# Altium footprint library SINA.PcbLib: 103 footprints (part 3 of 7)
Each footprint in its own frame and in the unit in brackets; x right, y up, seen from the top. Pads: shape width x height; smd on the part's side, far side on the other; paste and mask are expansions set on the pad; w line width, h text height; cw(c..) or ccw(c..) is an arc to the next point about the centre after c.
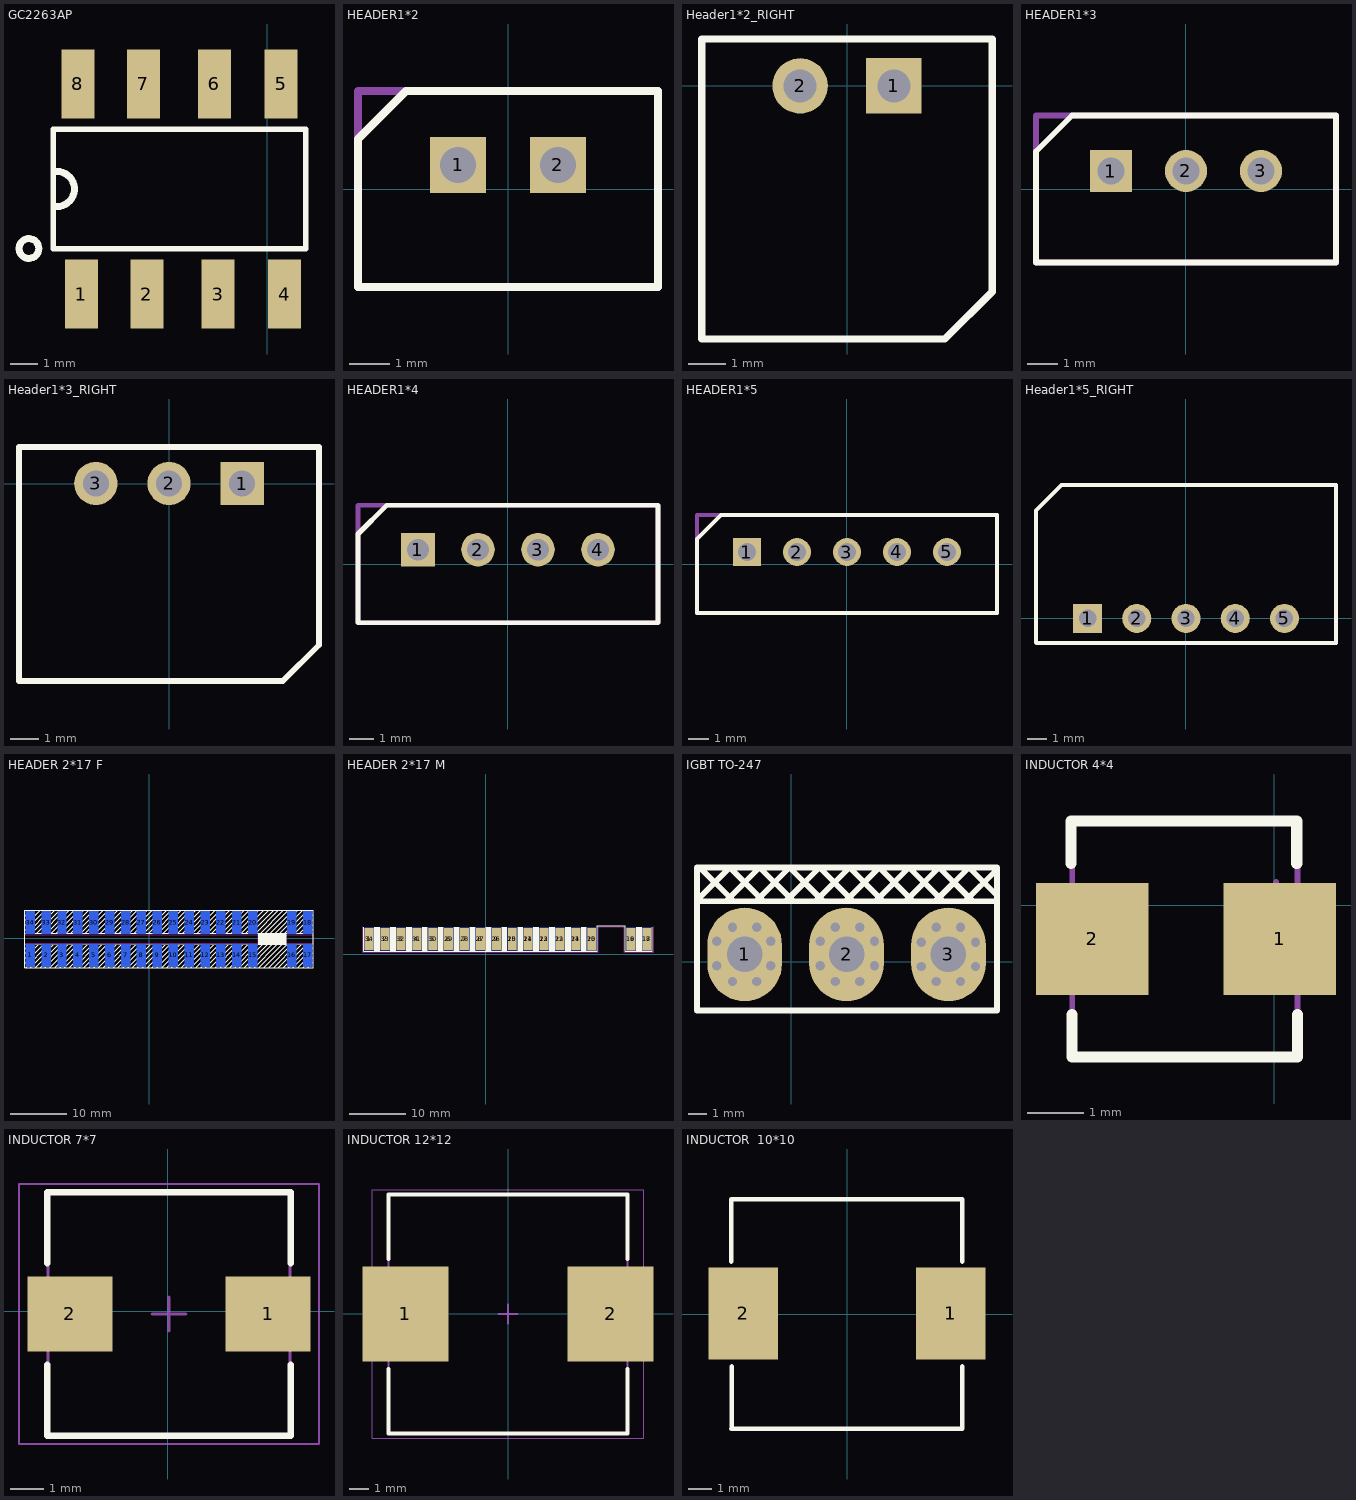
[diagram p2: the footprints below, top view; thin cyan lines are the x and y axes]

## GC2263AP [mm]
pads (8):
  rect 1.2x2.5 smd: 1(-6.731,2.413) 2(-4.36,2.413) 3(-1.778,2.413) 4(0.635,2.413) 5(0.508,10.033) 6(-1.905,10.033) 7(-4.487,10.033) 8(-6.858,10.033)
Top Overlay:
  circle w0.254: c-8.636,4.064 r0.359
  lines w0.2: -7.747,4.064 -7.747,8.382 1.397,8.382 1.397,4.064 -7.747,4.064
  lines w0.254: -7.62,5.588 ccw(c-7.62,6.223) -7.62,6.858
3D body "User Library-DIP-8P-M01.STEP": height 4.36, standoff -3, extent -7.876,2.288 1.524,10.158

## HEADER1*2 [mm] "2.50mm Male Shrouded Header, 2p"
height 5.9
pads (2):
  rect 1.4x1.4 hole 0.9: 1(-1.25,0.6) 2(1.25,0.6)
Top Overlay:
  lines w0.2: -3.75,-2.45 3.75,-2.45 3.75,2.45 -2.55,2.45 -3.75,1.25 -3.75,-2.45
Mechanical 13:
  lines w0.2: -3.75,-2.45 3.75,-2.45 3.75,2.45 -3.75,2.45 -3.75,-2.45
3D body "64600211622.stp": height 5.95, standoff -3.45, extent -3.75,-2.45 3.75,2.45

## Header1*2_RIGHT [mm] "2.50mm  Pitch Mini-SPOX Wire-to-Board Crimp Housing, Friction Lock, 2 Circuits, Right male"
pads (2):
  rect 1.5x1.5 hole 0.9: 1(1.27,0)
  round 1.5 hole 0.9: 2(-1.27,0)
Top Overlay:
  lines w0.2: -3.937,-6.858 2.61,-6.858 2.652,-6.858 3.937,-5.573 3.937,1.27 -3.937,1.27 -3.937,-6.858

## HEADER1*3 [mm] "2.50mm Male Shrouded Header, 3p"
height 5.9
pads (3):
  rect 1.4x1.4 hole 0.9: 1(-2.5,0.6)
  round 1.4 hole 0.9: 2(0,0.6) 3(2.5,0.6)
Top Overlay:
  lines w0.2: -3.8,2.45 -5,1.25 -5,-2.45 5,-2.45 5,2.45 -3.75,2.45
Mechanical 13:
  lines w0.2: -5,-2.45 5,-2.45 5,2.45 -5,2.45 -5,-2.45
3D body "64600311622.stp": height 5.95, standoff -3.45, extent -5,-2.45 5,2.45

## Header1*3_RIGHT [mm] "2.50mm  Pitch Mini-SPOX Wire-to-Board Crimp Housing, Friction Lock, 3 Circuits, Right male"
pads (3):
  rect 1.5x1.5 hole 0.9: 1(2.54,-0.001)
  round 1.5 hole 0.9: 2(0,0.002) 3(-2.54,0.002)
Top Overlay:
  lines w0.2: -5.207,-6.858 -5.207,1.272 5.207,1.272 5.207,-5.603 3.952,-6.858 -5.207,-6.858

## HEADER1*4 [mm] "2.50mm Male Shrouded Header, 4p"
height 5.9
pads (4):
  rect 1.4x1.4 hole 0.9: 1(-3.75,0.6)
  round 1.4 hole 0.9: 2(-1.25,0.6) 3(1.25,0.6) 4(3.75,0.6)
Top Overlay:
  lines w0.2: -5.05,2.45 -6.25,1.25 -6.25,-2.45 6.25,-2.45 6.25,2.45 -5,2.45
Mechanical 13:
  lines w0.2: -6.25,-2.45 -6.25,2.45 6.25,2.45 6.25,-2.45 -6.25,-2.45
3D body "64600411622.stp": height 5.95, standoff -3.45, extent -6.25,-2.45 6.25,2.45

## HEADER1*5 [mm] "2.50mm Male Shrouded Header, 5p"
height 5.9
pads (5):
  rect 1.4x1.4 hole 0.9: 1(-5,0.6)
  round 1.4 hole 0.9: 2(-2.5,0.6) 3(0,0.6) 4(2.5,0.6) 5(5,0.6)
Top Overlay:
  lines w0.2: 7.5,-2.45 -7.5,-2.45 -7.5,1.25 -6.3,2.45 7.5,2.45 7.5,-2.45
Mechanical 13:
  lines w0.2: -7.5,-2.45 -7.5,2.45 7.5,2.45 7.5,-2.45 -7.5,-2.45
3D body "64600511622.stp": height 5.95, standoff -3.45, extent -7.5,-2.45 7.5,2.45

## Header1*5_RIGHT [mm] "2.50mm  Pitch Mini-SPOX Wire-to-Board Crimp Housing, Friction Lock, 5 Circuits, Right male"
pads (5):
  rect 1.5x1.5 hole 0.9: 1(-5.08,0)
  round 1.5 hole 0.9: 2(-2.54,0) 3(0,0) 4(2.54,0) 5(5.08,0)
Top Overlay:
  lines w0.2: -7.74,-1.26 -7.74,5.57 -6.432,6.878 7.74,6.878 7.74,-1.27 -7.73,-1.27 ; -7.717,5.603 -6.462,6.858

## HEADER 2*17 F [mm]
pads (34):
  rect 1.6x4 smd far side: 1(-21.288,-3.066) 2(-18.447,-3.066) 3(-15.606,-3.066) 4(-12.766,-3.066) 5(-9.925,-3.066) 6(-7.084,-3.066) 7(-4.243,-3.066) 8(-1.403,-3.066) 9(1.438,-3.066) 10(4.279,-3.066) 11(7.119,-3.066) 12(9.96,-3.066) 13(12.801,-3.066) 14(15.642,-3.066) 15(18.482,-3.074) 16(25.483,-3.074) 17(28.322,-3.074) 18(28.322,2.802) 19(25.483,2.802) 20(18.482,2.802) 21(15.642,2.794) 22(12.801,2.794) 23(9.96,2.794) 24(7.119,2.794) 25(4.279,2.794) 26(1.438,2.794) 27(-1.403,2.794) 28(-4.243,2.794) 29(-7.084,2.794) 30(-9.925,2.794) 31(-12.766,2.794) 32(-15.606,2.794) 33(-18.447,2.794) 34(-21.288,2.794)
Top Overlay:
  drawing of 158 lines, arcs and shapes, not listed
Bottom Overlay:
  rectangle: -20.388,-5.226 -19.388,-0.946
  rectangle: -11.865,-5.176 -10.825,-0.946
  rectangle: -6.184,-5.176 -5.144,-0.946
  rectangle: 2.338,-5.176 3.378,-0.946
  rectangle: 8.02,-5.176 9.06,-0.946
  rectangle: 16.542,-5.176 17.582,-0.946
  rectangle: 26.382,-5.176 27.422,-0.946
  rectangle: -20.388,0.674 -19.388,4.954
  rectangle: -11.865,0.674 -10.825,4.904
  rectangle: -6.184,0.674 -5.144,4.904
  rectangle: 2.338,0.674 3.378,4.904
  rectangle: 8.02,0.674 9.06,4.904
  rectangle: 16.542,0.674 17.582,4.904
  rectangle: 26.382,0.674 27.422,4.904
  rectangle: -14.706,-5.176 -13.666,-0.946
  rectangle: -17.547,-5.176 -16.507,-0.946
  rectangle: -3.343,-5.176 -2.303,-0.946
  rectangle: -9.025,-5.176 -7.985,-0.946
  rectangle: 5.179,-5.176 6.219,-0.946
  rectangle: -0.502,-5.176 0.538,-0.946
  rectangle: 13.702,-5.176 14.742,-0.946
  rectangle: 10.861,-5.176 11.901,-0.946
  rectangle: -14.706,0.674 -13.666,4.904
  rectangle: -17.547,0.674 -16.507,4.904
  rectangle: -3.343,0.674 -2.303,4.904
  rectangle: -9.025,0.674 -7.985,4.904
  rectangle: 5.179,0.674 6.219,4.904
  rectangle: -0.502,0.674 0.538,4.904
  rectangle: 13.701,0.674 14.741,4.904
  rectangle: 10.861,0.674 11.901,4.904
  rectangle: 19.386,-5.355 24.582,5.084
  lines w0.2: -22.288,-0.936 -22.288,-5.256 19.482,-5.256 19.482,-0.921 ; -22.288,0.664 -22.288,4.984 19.482,4.984 ; 19.484,0.652 19.484,4.982 ; 24.482,-0.921 24.482,-5.256 29.322,-5.256 29.322,-0.936 ; 24.482,4.984 29.322,4.984 29.322,0.664 ; 24.483,0.652 24.483,4.982
Keep-Out Layer:
  lines w0.2: -22.287,-0.921 19.483,-0.921 19.483,0.652 -22.287,0.652 -22.287,-0.921 ; 24.483,-0.921 24.483,0.652 29.32,0.652 29.32,-0.921 24.483,-0.921
3D body: height 0.25, standoff 0, extent -22.1,0.5 -22.1,0.5
3D body: height 40, standoff -3, extent -22.287,-0.921 29.32,0.652

## HEADER 2*17 M [mm]
pads (34):
  rect 1.6x4 smd: 1(-20.81,2.71) 2(-17.969,2.71) 3(-15.129,2.71) 4(-12.288,2.71) 5(-9.447,2.71) 6(-6.606,2.71) 7(-3.766,2.71) 8(-0.925,2.71) 9(1.916,2.71) 10(4.756,2.71) 11(7.597,2.71) 12(10.438,2.71) 13(13.279,2.71) 14(16.119,2.71) 15(18.96,2.702) 16(25.961,2.702) 17(28.8,2.702)
  rect 1.6x4 smd far side: 18(28.8,2.702) 19(25.961,2.702) 20(18.96,2.702) 21(16.119,2.71) 22(13.279,2.71) 23(10.438,2.71) 24(7.597,2.71) 25(4.756,2.71) 26(1.916,2.71) 27(-0.925,2.71) 28(-3.766,2.71) 29(-6.606,2.71) 30(-9.447,2.71) 31(-12.288,2.71) 32(-15.129,2.71) 33(-17.969,2.71) 34(-20.81,2.71)
Top Overlay:
  rectangle: 26.86,0.6 27.9,4.83
  rectangle: 17.02,0.6 18.06,4.83
  rectangle: 14.179,0.6 15.219,4.83
  rectangle: 11.338,0.6 12.378,4.83
  rectangle: 8.498,0.6 9.538,4.83
  rectangle: 5.657,0.6 6.697,4.83
  rectangle: 2.816,0.6 3.856,4.83
  rectangle: -0.025,0.6 1.015,4.83
  rectangle: -2.865,0.6 -1.825,4.83
  rectangle: -5.706,0.6 -4.666,4.83
  rectangle: -8.547,0.6 -7.507,4.83
  rectangle: -11.388,0.6 -10.348,4.83
  rectangle: -14.228,0.6 -13.188,4.83
  rectangle: -17.069,0.6 -16.029,4.83
  rectangle: -19.91,0.55 -18.91,4.83
  lines w0.2: -21.81,4.84 -21.81,0.52 19.96,0.52 19.96,5.09 24.96,5.09 24.96,0.52 29.8,0.52 29.8,4.84
Bottom Overlay:
  rectangle: -19.91,0.55 -18.91,4.83
  rectangle: -17.069,0.6 -16.029,4.83
  rectangle: -14.228,0.6 -13.188,4.83
  rectangle: -11.388,0.6 -10.348,4.83
  rectangle: -8.547,0.6 -7.507,4.83
  rectangle: -5.706,0.6 -4.666,4.83
  rectangle: -2.865,0.6 -1.825,4.83
  rectangle: -0.025,0.6 1.015,4.83
  rectangle: 2.816,0.6 3.856,4.83
  rectangle: 5.657,0.6 6.697,4.83
  rectangle: 8.498,0.6 9.538,4.83
  rectangle: 11.338,0.6 12.378,4.83
  rectangle: 14.179,0.6 15.219,4.83
  rectangle: 17.02,0.6 18.06,4.83
  rectangle: 26.86,0.6 27.9,4.83
  lines w0.2: -21.81,4.84 -21.81,0.52 19.96,0.52 19.96,5.09 24.96,5.09 24.96,0.52 29.8,0.52 29.8,4.84
Keep-Out Layer:
  lines w0.2: -22,4.9 -22,0.35 20.16,0.35 20.16,4.9 24.71,4.9 ; 24.76,4.9 24.76,0.35 30,0.35 30,4.9

## HeatSink 70*22*6 [mm]
3D body: height 0.25, standoff 0, extent -2.6,2.7 -2.6,2.7
3D body: height 7, standoff 5, extent -34.4,-10.2 35.6,11.8
3D body: height 0.25, standoff 0, extent -7.6,1 -7.6,1
3D body: height 0.25, standoff 0, extent -8,1 -8,1
3D body: height 0.25, standoff 0, extent -8,2.1 -8,2.1
3D body: height 11, standoff 5, extent -34.4,10.4 -29.7,11.8
3D body: height 11, standoff 5, extent -28.464,10.4 -23.764,11.8
3D body: height 11, standoff 5, extent -22.527,10.4 -17.827,11.8
3D body: height 11, standoff 5, extent -16.591,10.4 -11.891,11.8
3D body: height 11, standoff 5, extent -10.655,10.4 -5.955,11.8
3D body: height 11, standoff 5, extent -4.718,10.4 -0.018,11.8
3D body: height 11, standoff 5, extent 1.218,10.4 5.918,11.8
3D body: height 11, standoff 5, extent 7.154,10.4 11.854,11.8
3D body: height 11, standoff 5, extent 13.091,10.4 17.791,11.8
3D body: height 11, standoff 5, extent 19.027,10.4 23.727,11.8
3D body: height 11, standoff 5, extent 24.964,10.4 29.664,11.8
3D body: height 11, standoff 5, extent 30.9,10.4 35.6,11.8
3D body: height 11, standoff 5, extent 30.9,7.457 35.6,8.857
3D body: height 11, standoff 5, extent 24.964,7.457 29.664,8.857
3D body: height 11, standoff 5, extent 19.027,7.457 23.727,8.857
3D body: height 11, standoff 5, extent 13.091,7.457 17.791,8.857
3D body: height 11, standoff 5, extent 7.154,7.457 11.854,8.857
3D body: height 11, standoff 5, extent 1.218,7.457 5.918,8.857
3D body: height 11, standoff 5, extent -4.718,7.457 -0.018,8.857
3D body: height 11, standoff 5, extent -10.655,7.457 -5.955,8.857
3D body: height 11, standoff 5, extent -16.591,7.457 -11.891,8.857
3D body: height 11, standoff 5, extent -22.527,7.457 -17.827,8.857
3D body: height 11, standoff 5, extent -28.464,7.457 -23.764,8.857
3D body: height 11, standoff 5, extent -34.4,7.457 -29.7,8.857
3D body: height 11, standoff 5, extent 30.9,4.514 35.6,5.914
3D body: height 11, standoff 5, extent 24.964,4.514 29.664,5.914
3D body: height 11, standoff 5, extent 19.027,4.514 23.727,5.914
3D body: height 11, standoff 5, extent 13.091,4.514 17.791,5.914
3D body: height 11, standoff 5, extent 7.154,4.514 11.854,5.914
3D body: height 11, standoff 5, extent 1.218,4.514 5.918,5.914
3D body: height 11, standoff 5, extent -4.718,4.514 -0.018,5.914
3D body: height 11, standoff 5, extent -10.655,4.514 -5.955,5.914
3D body: height 11, standoff 5, extent -16.591,4.514 -11.891,5.914
3D body: height 11, standoff 5, extent -22.527,4.514 -17.827,5.914
3D body: height 11, standoff 5, extent -28.464,4.514 -23.764,5.914
3D body: height 11, standoff 5, extent -34.4,4.514 -29.7,5.914
3D body: height 11, standoff 5, extent 30.9,1.572 35.6,2.972
3D body: height 11, standoff 5, extent 24.964,1.572 29.664,2.972
3D body: height 11, standoff 5, extent 19.027,1.572 23.727,2.972
3D body: height 11, standoff 5, extent 13.091,1.572 17.791,2.972
3D body: height 11, standoff 5, extent 7.154,1.572 11.854,2.972
3D body: height 11, standoff 5, extent 1.218,1.572 5.918,2.972
3D body: height 11, standoff 5, extent -4.718,1.572 -0.018,2.972
3D body: height 11, standoff 5, extent -10.655,1.572 -5.955,2.972
3D body: height 11, standoff 5, extent -16.591,1.572 -11.891,2.972
3D body: height 11, standoff 5, extent -22.527,1.572 -17.827,2.972
3D body: height 11, standoff 5, extent -28.464,1.572 -23.764,2.972
3D body: height 11, standoff 5, extent -34.4,1.572 -29.7,2.972
3D body: height 11, standoff 5, extent 30.9,-1.371 35.6,0.029
3D body: height 11, standoff 5, extent 24.964,-1.371 29.664,0.029
3D body: height 11, standoff 5, extent 19.027,-1.371 23.727,0.029
3D body: height 11, standoff 5, extent 13.091,-1.371 17.791,0.029
3D body: height 11, standoff 5, extent 7.154,-1.371 11.854,0.029
3D body: height 11, standoff 5, extent 1.218,-1.371 5.918,0.029
3D body: height 11, standoff 5, extent -4.718,-1.371 -0.018,0.029
3D body: height 11, standoff 5, extent -10.655,-1.371 -5.955,0.029
3D body: height 11, standoff 5, extent -16.591,-1.371 -11.891,0.029
3D body: height 11, standoff 5, extent -22.527,-1.371 -17.827,0.029
3D body: height 11, standoff 5, extent -28.464,-1.371 -23.764,0.029
3D body: height 11, standoff 5, extent -34.4,-1.371 -29.7,0.029
3D body: height 11, standoff 5, extent 30.9,-4.314 35.6,-2.914
3D body: height 11, standoff 5, extent 24.964,-4.314 29.664,-2.914
3D body: height 11, standoff 5, extent 19.027,-4.314 23.727,-2.914
3D body: height 11, standoff 5, extent 13.091,-4.314 17.791,-2.914
3D body: height 11, standoff 5, extent 7.154,-4.314 11.854,-2.914
3D body: height 11, standoff 5, extent 1.218,-4.314 5.918,-2.914
3D body: height 11, standoff 5, extent -4.718,-4.314 -0.018,-2.914
3D body: height 11, standoff 5, extent -10.655,-4.314 -5.955,-2.914
3D body: height 11, standoff 5, extent -16.591,-4.314 -11.891,-2.914
3D body: height 11, standoff 5, extent -22.527,-4.314 -17.827,-2.914
3D body: height 11, standoff 5, extent -28.464,-4.314 -23.764,-2.914
3D body: height 11, standoff 5, extent -34.4,-4.314 -29.7,-2.914
3D body: height 11, standoff 5, extent 30.9,-7.257 35.6,-5.857
3D body: height 11, standoff 5, extent 24.964,-7.257 29.664,-5.857
3D body: height 11, standoff 5, extent 19.027,-7.257 23.727,-5.857
3D body: height 11, standoff 5, extent 13.091,-7.257 17.791,-5.857
3D body: height 11, standoff 5, extent 7.154,-7.257 11.854,-5.857
3D body: height 11, standoff 5, extent 1.218,-7.257 5.918,-5.857
3D body: height 11, standoff 5, extent -4.718,-7.257 -0.018,-5.857
3D body: height 11, standoff 5, extent -10.655,-7.257 -5.955,-5.857
3D body: height 11, standoff 5, extent -16.591,-7.257 -11.891,-5.857
3D body: height 11, standoff 5, extent -22.527,-7.257 -17.827,-5.857
3D body: height 11, standoff 5, extent -28.464,-7.257 -23.764,-5.857
3D body: height 11, standoff 5, extent -34.4,-7.257 -29.7,-5.857
3D body: height 11, standoff 5, extent 30.9,-10.2 35.6,-8.8
3D body: height 11, standoff 5, extent 24.964,-10.2 29.664,-8.8
3D body: height 11, standoff 5, extent 19.027,-10.2 23.727,-8.8
3D body: height 11, standoff 5, extent 13.091,-10.2 17.791,-8.8
3D body: height 11, standoff 5, extent 7.154,-10.2 11.854,-8.8
3D body: height 11, standoff 5, extent 1.218,-10.2 5.918,-8.8
3D body: height 11, standoff 5, extent -4.718,-10.2 -0.018,-8.8
3D body: height 11, standoff 5, extent -10.655,-10.2 -5.955,-8.8
3D body: height 11, standoff 5, extent -16.591,-10.2 -11.891,-8.8
3D body: height 11, standoff 5, extent -22.527,-10.2 -17.827,-8.8
3D body: height 11, standoff 5, extent -28.464,-10.2 -23.764,-8.8
3D body: height 11, standoff 5, extent -34.4,-10.2 -29.7,-8.8

## IGBT TO-247 [mm]
pads (3):
  oval 4x5 hole 1.9: 1(-2.5,0.4) 2(2.95,0.4) 3(8.4,0.4)
via -1.1,-0.2 diameter 0.9 hole 0.5
via -4,-0.2 diameter 0.9 hole 0.5
via -1.1,1.1 diameter 0.9 hole 0.5
via -4,1.1 diameter 0.9 hole 0.5
via -1.85,1.85 diameter 0.9 hole 0.5
via -1.85,-1.05 diameter 0.9 hole 0.5
via -3.15,1.85 diameter 0.9 hole 0.5
via -3.15,-1.05 diameter 0.9 hole 0.5
via 3.65,1.85 diameter 0.9 hole 0.5
via 3.65,-1.05 diameter 0.9 hole 0.5
via 2.35,1.85 diameter 0.9 hole 0.5
via 2.35,-1.05 diameter 0.9 hole 0.5
via 9.05,1.85 diameter 0.9 hole 0.5
via 9.05,-1.05 diameter 0.9 hole 0.5
via 7.75,1.85 diameter 0.9 hole 0.5
via 7.75,-1.05 diameter 0.9 hole 0.5
via 6.95,1.05 diameter 0.9 hole 0.5
via 9.85,1.05 diameter 0.9 hole 0.5
via 6.95,-0.25 diameter 0.9 hole 0.5
via 9.85,-0.25 diameter 0.9 hole 0.5
via 1.55,1.1 diameter 0.9 hole 0.5
via 4.45,1.1 diameter 0.9 hole 0.5
via 1.55,-0.2 diameter 0.9 hole 0.5
via 4.45,-0.2 diameter 0.9 hole 0.5
Top Overlay:
  lines w0.3: -4.9,5.05 -3.1,3.25 ; -3.55,3.25 -3.5,3.25 -1.7,5.05 ; -3.45,3.3 -1.7,5.05 ; -1.9,3.25 -0.1,5.05 ; -1.85,3.3 -0.1,5.05 ; -1.55,3.3 -3.3,5.05 ; -1.5,3.25 -3.3,5.05 ; -0.3,3.25 1.5,5.05 ; -0.25,3.3 1.5,5.05 ; 0.05,3.3 -1.7,5.05 ; 0.1,3.25 -1.7,5.05 ; 1.3,3.25 3.1,5.05 ; 1.35,3.3 3.1,5.05 ; 1.65,3.3 -0.1,5.05 ; 1.7,3.25 -0.1,5.05 ; 2.9,3.25 4.7,5.05 ; 2.95,3.3 4.7,5.05 ; 3.25,3.3 1.5,5.05 ; 3.3,3.25 1.5,5.05 ; 4.5,3.25 6.3,5.05 ; 4.55,3.3 6.3,5.05 ; 4.85,3.3 3.1,5.05 ; 4.9,3.25 3.1,5.05 ; 6.1,3.25 7.9,5.05 ; 6.15,3.3 7.9,5.05 ; 6.45,3.3 4.7,5.05 ; 6.5,3.25 4.7,5.05 ; 7.7,3.25 9.5,5.05 ; 7.75,3.3 9.5,5.05 ; 8.05,3.3 6.3,5.05 ; 8.1,3.25 6.3,5.05 ; 9.3,3.25 11,4.95 11,-2.6 -5.05,-2.6 -5.05,5.05 11,5.05 ; 9.65,3.3 7.9,5.05 ; 9.7,3.25 7.9,5.05 ; 10.95,3.6 9.5,5.05 ; 11,3.25 -5.05,3.25 -5.05,3.3 -3.3,5.05
3D body "User Library-PG-TO247-3-21.STEP": height 26.95, standoff -14.18, extent -5,-2.6 10.9,2.5

## INDUCTOR 4*4 [mm]
pads (2):
  rect 2x2 smd: 1(0.1,-0.6) 2(-3.239,-0.6)
Top Overlay:
  lines w0.2: -3.614,0.742 -3.614,1.5 0.4,1.5 0.4,0.742 ; -3.6,-1.942 -3.6,-2.7 0.414,-2.7 0.414,-1.942
Mechanical 13:
  lines w0.1: -3.594,-2.7 -3.594,1.5 0.414,1.5 0.414,-2.7 -3.594,-2.7
Mechanical 15:
  lines w0.1: -0.464,-0.083 0.536,-0.083 ; 0.036,-0.583 0.036,0.417
3D body: height 3, standoff 0, extent -3.594,-2.7 0.4,1.5

## INDUCTOR 7*7 [mm]
pads (2):
  rect 2.55x2.25 smd: 1(3.011,-0.083) 2(-2.939,-0.083)
Top Overlay:
  lines w0.2: -3.614,-1.608 -3.614,-3.733 3.686,-3.733 3.686,-1.608 ; -3.614,1.442 -3.614,3.567 3.686,3.567 3.686,1.442
Mechanical 13:
  lines w0.1: -3.594,-3.713 -3.594,3.547 3.666,3.547 3.666,-3.713 -3.594,-3.713
Mechanical 15:
  lines w0.05: -4.464,-3.983 -4.464,3.817 4.536,3.817 4.536,-3.983 -4.464,-3.983
  lines w0.1: -0.464,-0.083 0.536,-0.083 ; 0.036,-0.583 0.036,0.417
3D body: height 3, standoff 0, extent -3.594,-3.713 3.666,3.547

## INDUCTOR 12*12 [mm] "Precision Wire Wound Inductor, 2-Leads, Body 12.45x12.45mm, IPC Medium Density"
height 7.7
pads (2):
  rect 4.5x4.95 smd: 1(-5.375,0) 2(5.375,0)
Top Overlay:
  lines w0.2: -6.25,-2.875 -6.25,-6.25 6.25,-6.25 6.25,-2.875 ; -6.25,2.875 -6.25,6.25 6.25,6.25 6.25,2.875
Mechanical 13:
  lines w0.1: -6.25,-6.25 -6.25,6.25 6.25,6.25 6.25,-6.25 -6.25,-6.25
Mechanical 15:
  lines w0.05: -7.1,-6.5 -7.1,6.5 7.1,6.5 7.1,-6.5 -7.1,-6.5
  lines w0.1: -0.5,0 0.5,0 ; 0,-0.5 0,0.5
3D body: height 7.7, standoff 0, extent -6.25,-6.25 6.25,6.25

## INDUCTOR  10*10 [mm]
pads (2):
  rect 3x4 smd: 1(4.497,0.027) 2(-4.503,0.027)
Top Overlay:
  lines w0.2: -5.017,-4.973 4.997,-4.973 4.997,-2.273 ; -5.017,2.277 -5.017,4.977 4.997,4.977 4.997,2.277 ; -4.997,-4.973 -4.997,-2.273
3D body: height 3, standoff 0, extent -4.997,-4.973 4.997,4.974